# Altium footprint library 5ko.PcbLib: 126 footprints (part 2 of 8)
Each footprint in its own frame and in the unit in brackets; x right, y up, seen from the top. Pads: shape width x height; smd on the part's side, far side on the other; paste and mask are expansions set on the pad; w line width, h text height; cw(c..) or ccw(c..) is an arc to the next point about the centre after c.
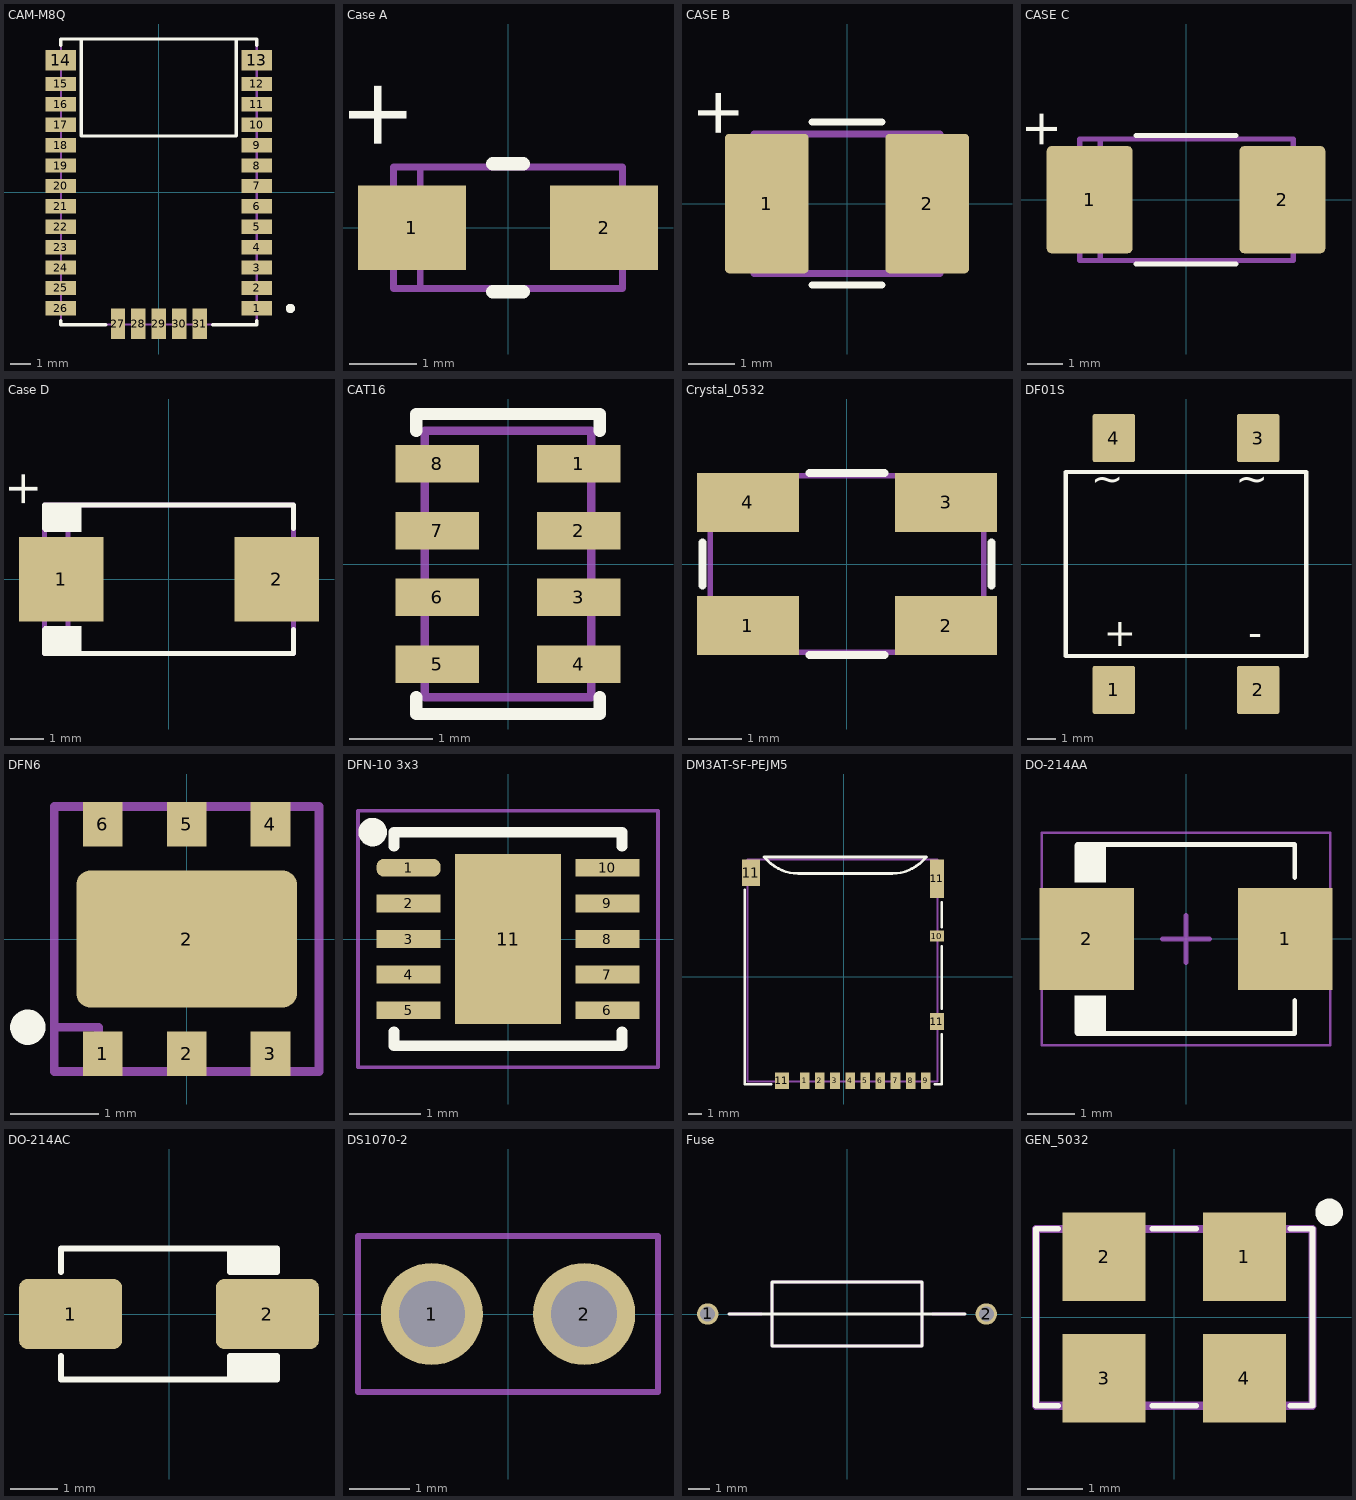
[diagram p1: the footprints below, top view; thin cyan lines are the x and y axes]

## CAM-M8Q [mm]
pads (31):
  rect 1.5x0.7 smd: 1(4.8,-5.7) 2(4.8,-4.7) 3(4.8,-3.7) 4(4.8,-2.7) 5(4.8,-1.7) 6(4.8,-0.7) 7(4.8,0.3) 8(4.8,1.3) 9(4.8,2.3) 10(4.8,3.3) 11(4.8,4.3) 12(4.8,5.3) 15(-4.8,5.3) 16(-4.8,4.3) 17(-4.8,3.3) 18(-4.8,2.3) 19(-4.8,1.3) 20(-4.8,0.3) 21(-4.8,-0.7) 22(-4.8,-1.7) 23(-4.8,-2.7) 24(-4.8,-3.7) 25(-4.8,-4.7) 26(-4.8,-5.7)
  rect 1.5x1 smd: 13(4.8,6.45) 14(-4.8,6.45)
  rect 0.7x1.5 smd: 27(-2,-6.45) 28(-1,-6.45) 29(0,-6.45) 30(1,-6.45) 31(2,-6.45)
Top Overlay:
  circle w0.254: c6.45,-5.7 r0.1
  lines w0.16: -4.8,-6.3 -4.8,-6.5 -2.6,-6.5 ; -4.8,7.2 -4.8,7.5 4.8,7.5 4.8,7.2 ; -3.8,7.5 -3.8,2.75 3.8,2.75 3.8,7.5 ; 2.63,-6.5 4.45,-6.5 4.8,-6.5 4.8,-6.3
Mechanical 15:
  lines w0.1: -4.8,-6.5 4.8,-6.5 4.8,7.5 -4.8,7.5 -4.8,-6.5
  text ".Designator" at -1.9,-0.2 h0.5
Multi-Layer:
  pour cut-out: -3.8,7.5 -3.8,2.75 3.8,2.75 3.8,7.5
3D body "CAM.STEP": height 2.02, standoff 0.01, extent -4.81,-6.506 4.79,7.494

## Case A [mm]
height 1.6
pads (2):
  rect 1.6x1.25 smd: 1(-1.425,0) 2(1.425,0)
Top Overlay:
  lines w0.2: -0.225,-0.95 0.225,-0.95 ; -0.225,0.95 0.225,0.95
  text "+" at -1.5,1.1 h1
Mechanical 15:
  lines w0.1: -1.4,-0.9 -1.3,-0.9 -1.3,0.9 -1.7,0.9 ; -1.7,0.9 -1.7,-0.9 1.7,-0.9 1.7,0.9 -1.7,0.9
  text ".Designator" at -1.6,-0.1 h0.5
3D body "CAP_TANT_3216-18_A_case.step": height 1.8, standoff 0, extent -1.7,-0.9 1.7,0.9

## CASE B [mm]
pads (2):
  rrect10% 1.8x3 smd mask+0.07: 1(-1.725,0) 2(1.725,0)
Top Overlay:
  lines w0.15: -0.75,-1.75 0.75,-1.75 ; -0.75,1.75 0.75,1.75
  text "+" at -2.325,1.375 h1
Mechanical 15:
  lines w0.15: -1.3,-1.5 -1.3,1.5 ; -2,-1.5 2,-1.5 2,1.5 -2,1.5 -2,-1.5
  text ".Designator" at -1.1,-0.2 h0.5
3D body "User Library-AVX_BCASE.step": height 2.03, standoff 0, extent -1.85,-1.465 1.85,1.465

## CASE C [mm]
pads (2):
  rrect10% 2.4x3 smd mask+0.07: 1(-2.7,0) 2(2.7,0)
Top Overlay:
  lines w0.15: -1.4,-1.8 1.4,-1.8 ; -1.4,1.8 1.4,1.8
  text "+" at -3.6,1.4 h1
Mechanical 15:
  lines w0.15: -2.4,-1.7 -2.4,1.7 ; -2.975,-1.7 3,-1.7 3,1.7 -2.975,1.7 -2.975,-1.7
  text ".Designator" at -2.075,-0.2 h0.5
3D body "User Library-AVX_C_CASE.step": height 2.7, standoff 0, extent -3.05,-1.675 3.05,1.675

## Case D [mm]
pads (2):
  rect 2.5x2.5 smd mask+0.07: 1(-3.2,0) 2(3.2,0)
Top Overlay:
  region: -3.7,-1.4 -2.6,-1.4 -2.6,-2.2 -3.7,-2.2
  region: -3.7,1.4 -2.6,1.4 -2.6,2.2 -3.7,2.2
  lines w0.15: -3.7,-1.5 -3.7,-2.2 3.7,-2.2 3.7,-1.5 ; -3.7,1.5 -3.7,2.2 3.7,2.2 3.7,1.5
  text "+" at -3.9,2.1 h1
Mechanical 15:
  lines w0.15: -3,-2.2 -3,2.2 ; -3.7,-2.2 3.7,-2.2 3.7,2.2 -3.7,2.2 -3.7,-2.2
  text ".Designator" at -1.6,-0.1 h0.5
3D body "User Library-AVX_D_CASE.step": height 3.01, standoff 0, extent -3.7,-2.225 3.7,2.225

## CAT16 [mm] "Chip Array, Concave, 8-Leads, Pitch 0,80mm,  Body 3,20x1,55mm,  IPC Medium Density"
height 0.6
pads (8):
  rect 1x0.45 smd: 1(0.85,1.2) 2(0.85,0.4) 3(0.85,-0.4) 4(0.85,-1.2) 5(-0.85,-1.2) 6(-0.85,-0.4) 7(-0.85,0.4) 8(-0.85,1.2)
Top Overlay:
  lines w0.15: -1.1,-1.6 -1.1,-1.8 1.1,-1.8 1.1,-1.6 ; -1.1,1.6 -1.1,1.8 1.1,1.8 1.1,1.6
Mechanical 15:
  lines w0.1: -1,-1.6 1,-1.6 1,1.6 -1,1.6 -1,-1.6
  text ".Designator" at 0.2,-1.3 h0.5
3D body "cat16-470j4lf.stp": height 0.49, standoff -0.01, extent -0.775,-1.6 0.775,1.6

## Crystal_0532 [mm]
pads (4):
  rect 1.9x1.1 smd: 1(-1.85,-1.15) 2(1.85,-1.15) 3(1.85,1.15) 4(-1.85,1.15)
Top Overlay:
  lines w0.15: -2.7,-0.4 -2.7,0.4 ; -0.7,-1.7 0.7,-1.7 ; -0.7,1.7 0.7,1.7 ; 2.7,-0.4 2.7,0.4
Mechanical 15:
  lines w0.1: -2.55,-1.65 2.55,-1.65 2.55,1.65 -0.55,1.65 -2.55,1.65 -2.55,-1.65
  text ".Designator" at -1.55,-0.05 h0.5
3D body "CRYSTALSMD5X32.step": height 1, standoff 0, extent -2.5,-1.6 2.5,1.6

## DF01S [mm]
height 2.6
pads (4):
  rrect10% 1.5x1.7 smd mask+0.07: 1(-2.55,-4.45) 2(2.55,-4.45) 3(2.55,4.45) 4(-2.55,4.45)
Top Overlay:
  lines w0.15: -4.25,-3.25 -4.25,3.25 4.25,3.25 4.25,-3.25 -4.25,-3.25
  text "~" at -2.2,3.4 h1
  text "~" at 2.9,3.4 h1
  text "-" at 2.2,-2.9 h1
  text "+" at -2.9,-2.9 h1
3D body "User Library-SDIP-1.step": height 2.93, standoff 0, extent -4.25,-5 4.25,5

## DFN6 [mm]
pads (7):
  rect 0.45x0.5 smd: 1(-0.95,-1.3) 2(0,-1.3) 3(0.95,-1.3) 4(0.95,1.3) 5(0,1.3) 6(-0.95,1.3)
  rrect20% 2.5x1.55 smd: 2(0,0)
Top Overlay:
  circle w0.2: c-1.8,-1 r0.1
Mechanical 15:
  lines w0.1: -1.5,-1 -1,-1 -1,-1.5 ; -1.5,-1.5 -1.5,1.5 1.5,1.5 1.5,-1.5 -1.5,-1.5
  text ".Designator" at -1.8,-0.1 h0.5
3D body "DFN6-3x3x0_80.step": height 0.85, standoff 0.05, extent -1.5,-1.5 1.5,1.5

## DFN-10 3x3 [mm]
height 0.8
pads (11):
  rrect80% 0.9x0.25 smd: 1(-1.395,1)
  rect 0.9x0.25 smd: 2(-1.395,0.5) 3(-1.395,0) 4(-1.395,-0.5) 5(-1.395,-1) 6(1.395,-1) 7(1.395,-0.5) 8(1.395,0) 9(1.395,0.5) 10(1.395,1)
  rect 1.49x2.38 smd: 11(0,0)
Top Overlay:
  circle w0.2: c-1.9,1.5 r0.1
  lines w0.15: -1.6,-1.3 -1.6,-1.5 1.6,-1.5 1.6,-1.3 ; -1.6,1.3 -1.6,1.5 1.6,1.5 1.6,1.3
Mechanical 15:
  lines w0.05: -2.105,-1.8 -2.105,1.8 2.105,1.8 2.105,-1.8 -2.105,-1.8
  text ".Designator" at -0.9,-0.1 h0.3
3D body "User Library-DFN10(3x3).step": height 0.76, standoff 0, extent -1.501,-1.5 1.501,1.5

## DM3AT-SF-PEJM5 [mm] "Micro SD"
pads (14):
  rect 0.7x1.2 smd: 1(-2.85,-7.55) 2(-1.75,-7.55) 3(-0.65,-7.55) 4(0.45,-7.55) 5(1.55,-7.55) 6(2.65,-7.55) 7(3.75,-7.55) 8(4.85,-7.55) 9(5.95,-7.55)
  rect 1x0.8 smd: 10(6.75,2.95)
  rect 1.3x1.9 smd: 11(-6.75,7.55)
  rect 1x1.2 smd: 11(-4.5,-7.55) 11(6.75,-3.25)
  rect 1x2.8 smd: 11(6.75,7.1)
Top Overlay:
  lines w0.2: -7.2,6.3 -7.2,-7.8 -5.3,-7.8 ; 6.6,-7.8 7.1,-7.8 7.1,-4.2 ; 7.1,-2.3 7.1,2.2 ; 7.1,3.6 7.1,5.4 ; -5.8,8.7 -5.498,8.398 ccw(c-3.33,10.566) -3.33,7.5 -1,7.5 3.53,7.5 ccw(c3.53,10.566) 5.698,8.398 6,8.7 -5.8,8.7
Mechanical 15:
  lines w0.15: -7,-7.6 6.8,-7.6 6.8,8.5 -7,8.5 -7,-7.6
  text ".Designator" at -1.9,-0.1 h0.5
3D body "DM3AT-SF-PEJM5.STEP": height 1.7, standoff 0.02, extent -7,-7.65 6.85,8.5

## DO-214AA [mm] "Molded Diode, 2-Leads, Body 4,31x3,62mm, IPC Medium Density"
height 2.62
pads (2):
  rect 2x2.15 smd: 1(2.1,0) 2(-2.1,0)
Top Overlay:
  region: -2.35,2 -2.35,1.2 -1.7,1.2 -1.7,2
  region: -2.35,-2 -2.35,-1.2 -1.7,-1.2 -1.7,-2
  lines w0.1: -2.3,-2 2.3,-2 2.3,-1.3 ; -2.3,2 2.3,2 2.3,1.3
Mechanical 15:
  lines w0.05: -3.05,-2.25 -3.05,2.25 3.05,2.25 3.05,-2.25 -3.05,-2.25
  lines w0.1: -0.5,0 0.5,0 ; 0,-0.5 0,0.5
3D body "User Library-DIOM5539X24.step": height 2.45, standoff 0.03, extent -2.75,-1.95 2.75,1.95

## DO-214AC [mm] "JEDEC DO214 variation AC. SMA"
height 2.5
pads (2):
  rrect25% 2.2x1.5 smd: 1(-2.1,0) 2(2.1,0)
Top Overlay:
  rectangle: 1.3,0.9 2.3,1.4
  rectangle: 1.3,-1.4 2.3,-0.9
  lines w0.127: -2.3,-0.9 -2.3,-1.4 2.3,-1.4 2.3,-0.9 1.3,-0.9 1.3,-1.4 ; -2.3,0.9 -2.3,1.4 2.3,1.4 2.3,0.9 1.3,0.9 ; 1.3,0.911 1.3,1.4
3D body "SW3dPS-DO-214AC SMA.STEP": height 2.42, standoff 0.02, extent -2.6,-1.3 2.6,1.3

## DS1070-2 [mm] "PLS-2 with fix"
pads (2):
  round 1.7 hole 1.1: 1(-1.27,0) 2(1.27,0)
Mechanical 15:
  lines w0.1: -2.5,-1.3 2.5,-1.3 2.5,1.3 -2.5,1.3 -2.5,-1.3
  text ".Designator" at -1.7,-0.1 h0.5
3D body "User Library-DS1070-2 (WF-2 CONNFLY).step": height 11.4, standoff -3.3, extent -2.54,-3.5 2.54,2.4

## Fuse [mm]
pads (2):
  round 1 hole 0.7 mask+0.1: 1(-6.5,0) 2(6.5,0)
Top Overlay:
  lines w0.15: -5.5,0 -3.5,0 ; 5.5,0 -3.5,0 ; -3.5,0 -3.5,1.5 3.5,1.5 3.5,-1.5 -3.5,-1.5 -3.5,0
Mechanical 15:
  lines w0.15: -5.5,0 -4,0 ; 4,0 5.5,0 ; -3.5,-1.5 3.5,-1.5 3.5,1.5 -3.5,1.5 -3.5,-1.5
  text ".Designator" at -1.7,-0.1 h0.5
3D body: height 3.3, standoff 2.7, extent -6.8,-0.3 -6.2,0.3
3D body: height 3.3, standoff 2.7, extent 6.2,-0.3 6.8,0.3
3D body: height 3.3, standoff 2.7, extent 3.5,-0.3 6.5,0.3
3D body: height 3.3, standoff 2.7, extent -6.5,-0.3 -3.5,0.299
3D body: height 3, standoff -3, extent 6.202,-0.299 6.8,0.3
3D body: height 3, standoff -3, extent -6.797,-0.299 -6.2,0.3
3D body: height 4.5, standoff 1.5, extent -3.5,-1.5 3.5,1.498

## GEN_5032 [mm] "3H53-BT"
height 1
pads (4):
  rect 1.5x1.6 smd paste-0.75 mask+0: 1(1.27,1.1) 2(-1.27,1.1) 3(-1.27,-1.1) 4(1.27,-1.1)
Top Overlay:
  circle w0.25: c2.8,1.9 r0.125
  lines w0.1: -2.1,-1.6 -2.5,-1.6 -2.5,1.6 -2.1,1.6 ; -0.4,-1.6 0.4,-1.6 ; -0.4,1.6 0.4,1.6 ; 2.1,-1.6 2.5,-1.6 2.5,1.6 2.1,1.6
Mechanical 13:
  lines w0.025: -2.5,-1.6 -2.5,1.6 2.5,1.6 2.5,-1.6 -2.5,-1.6
Mechanical 15:
  lines w0.152: -2.5,-1.6 -2.5,1.6 2.5,1.6 2.5,-1.6 -2.5,-1.6
3D body "CDFN4_5X3P2_MCH.step": height 0.85, standoff 0, extent -2.5,-1.6 2.5,1.6